# Altium footprint library BaseBoard.PcbLib: 128 footprints (part 6 of 8)
Each footprint in its own frame and in the unit in brackets; x right, y up, seen from the top. Pads: shape width x height; smd on the part's side, far side on the other; paste and mask are expansions set on the pad; w line width, h text height; cw(c..) or ccw(c..) is an arc to the next point about the centre after c.
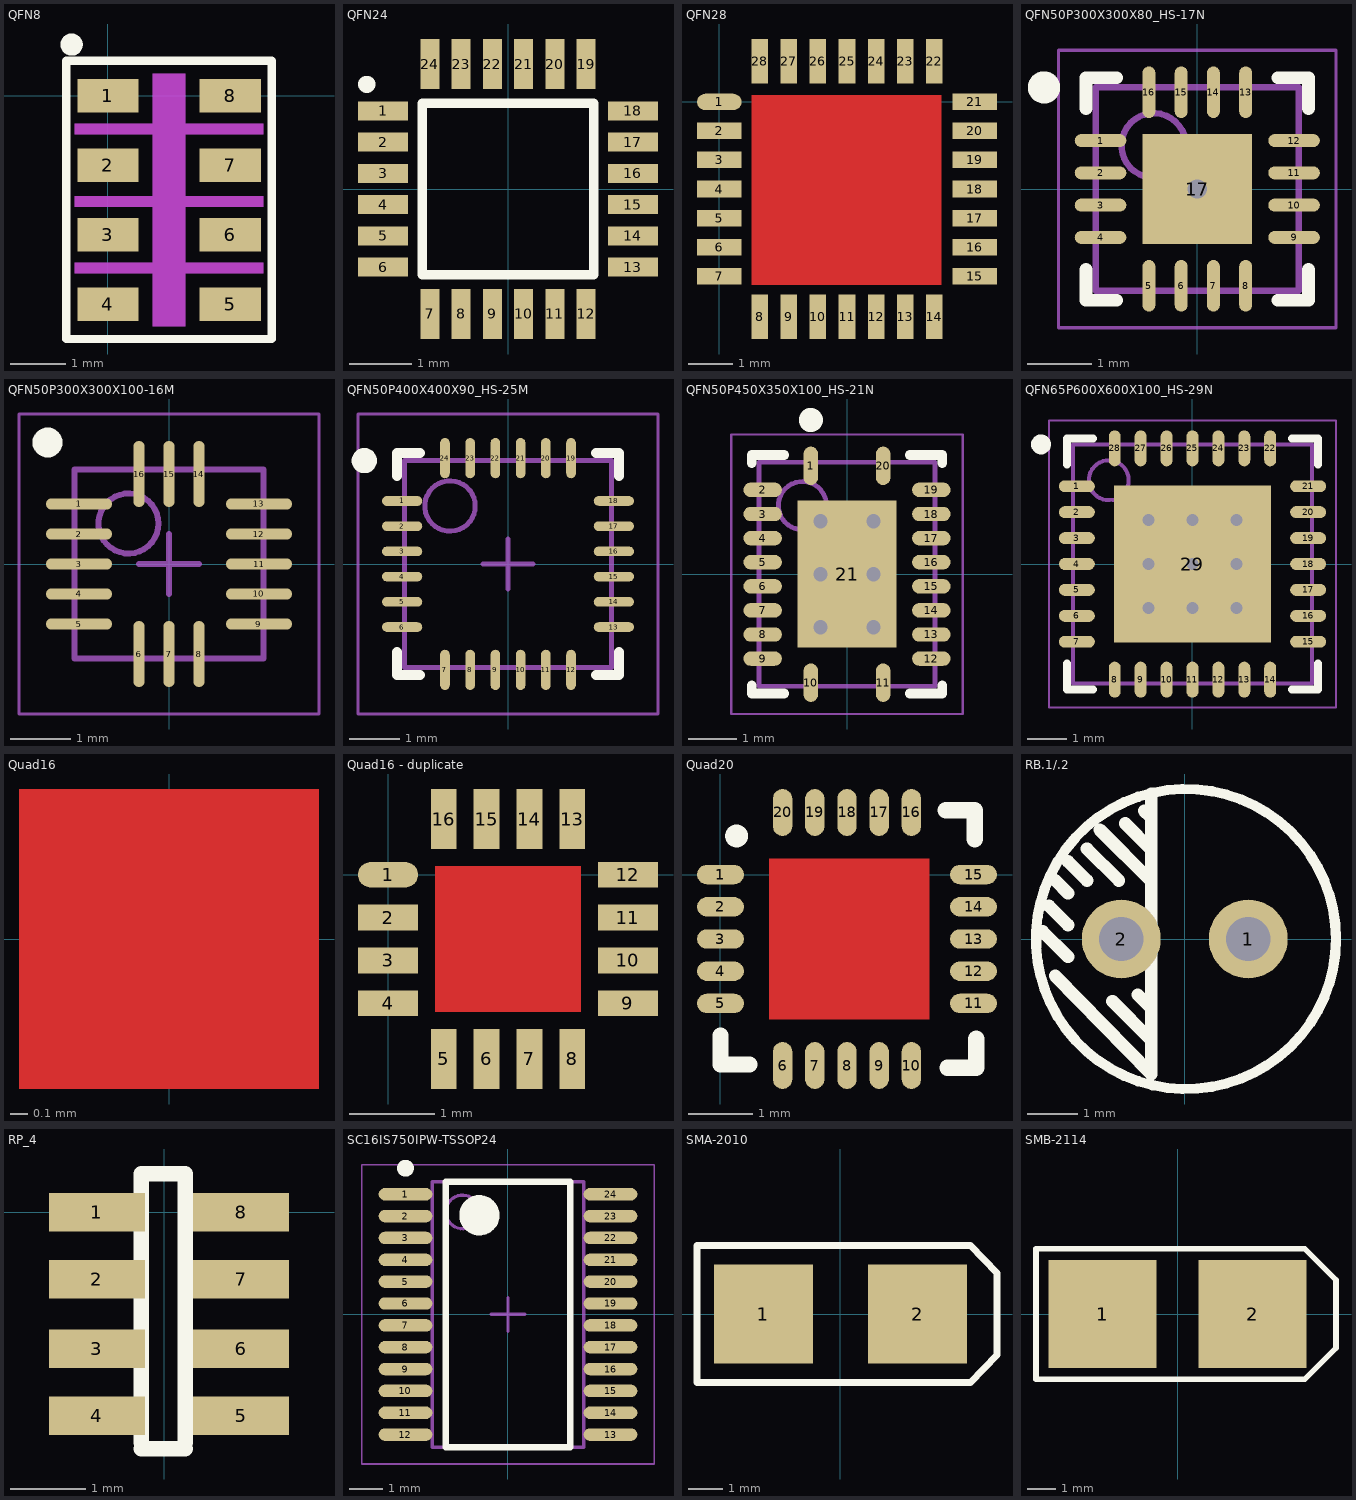
[diagram p5: the footprints below, top view; thin cyan lines are the x and y axes]

## QFN8 [mm] "5*3*1.7"
pads (8):
  rect 1.1x0.6 smd: 1(0,0) 2(0,-1.25) 3(0,-2.5) 4(0,-3.75) 5(2.2,-3.75) 6(2.2,-2.5) 7(2.2,-1.25) 8(2.2,0)
Top Overlay:
  circle w0.2: c-0.651,0.919 r0.1
  lines w0.152: -0.75,-4.375 -0.75,0.625 2.95,0.625 2.95,-4.375 -0.75,-4.375
Mechanical 1 keep-out:
  rectangle: 0.8,-4.15 1.4,0.4
  rectangle: -0.6,-0.7 2.8,-0.5
  rectangle: -0.6,-2 2.8,-1.8
  rectangle: -0.6,-3.2 2.8,-3
3D body: height 1, standoff 0, extent -0.6,-4.4 2.8,0.6

## QFN24 [mm] "4 * 4 mm"
pads (24):
  rect 0.8x0.3 smd: 1(-2,1.25) 2(-2,0.75) 3(-2,0.25) 4(-2,-0.25) 5(-2,-0.75) 6(-2,-1.25) 13(2,-1.25) 14(2,-0.75) 15(2,-0.25) 16(2,0.25) 17(2,0.75) 18(2,1.25)
  rect 0.3x0.8 smd: 7(-1.25,-2) 8(-0.75,-2) 9(-0.25,-2) 10(0.25,-2) 11(0.75,-2) 12(1.25,-2) 19(1.25,2) 20(0.75,2) 21(0.25,2) 22(-0.25,2) 23(-0.75,2) 24(-1.25,2)
Top Overlay:
  circle w0.254: c-2.26,1.675 r0.01
  lines w0.152: -1.372,-1.375 -1.372,1.375 1.375,1.375 1.375,-1.375 -1.372,-1.375

## QFN28 [mm]
pads (28):
  oval 1x0.37 smd: 1(0,0)
  rect 1x0.37 smd: 2(0,-0.65) 3(0,-1.3) 4(0,-1.95) 5(0,-2.6) 6(0,-3.25) 7(0,-3.9) 15(5.72,-3.9) 16(5.72,-3.25) 17(5.72,-2.6) 18(5.72,-1.95) 19(5.72,-1.3) 20(5.72,-0.65) 21(5.72,0)
  rect 0.37x1 smd: 8(0.91,-4.81) 9(1.56,-4.81) 10(2.21,-4.81) 11(2.86,-4.81) 12(3.51,-4.81) 13(4.16,-4.81) 14(4.81,-4.81) 22(4.81,0.91) 23(4.16,0.91) 24(3.51,0.91) 25(2.86,0.91) 26(2.21,0.91) 27(1.56,0.91) 28(0.91,0.91)
Top Layer:
  rectangle: 0.725,-4.1 4.975,0.15

## QFN50P300X300X80_HS-17N [mm] "QFN, 16-Leads, Body 3.00x3.00mm, Pitch 0.50mm, Thermal Pad 1.70x1.70mm, IPC Medium Density"
height 0.8
pads (17):
  oval 0.8x0.2 smd: 1(-1.5,0.75) 2(-1.5,0.25) 3(-1.5,-0.25) 4(-1.5,-0.75) 9(1.5,-0.75) 10(1.5,-0.25) 11(1.5,0.25) 12(1.5,0.75)
  oval 0.2x0.8 smd: 5(-0.75,-1.5) 6(-0.25,-1.5) 7(0.25,-1.5) 8(0.75,-1.5) 13(0.75,1.5) 14(0.25,1.5) 15(-0.25,1.5) 16(-0.75,1.5)
  rect 1.7x1.7 smd: 17(0,0)
via 0,0 diameter 0.6 hole 0.3
Top Overlay:
  circle w0.25: c-2.375,1.575 r0.125
  lines w0.2: -1.725,-1.25 -1.725,-1.725 -1.25,-1.725 ; -1.725,1.25 -1.725,1.725 -1.25,1.725 ; 1.25,-1.725 1.725,-1.725 1.725,-1.25 ; 1.25,1.725 1.725,1.725 1.725,1.25
Mechanical 13:
  circle w0.1: c-0.675,0.675 r0.5
  lines w0.1: -1.575,-1.575 1.575,-1.575 1.575,1.575 -1.575,1.575 -1.575,-1.575
Mechanical 15:
  lines w0.05: -2.15,-2.15 2.15,-2.15 2.15,2.15 -2.15,2.15 -2.15,-2.15
  lines w0.1: -0.5,0 0.5,0 ; 0,-0.5 0,0.5
3D body: height 0.8, standoff 0.01, extent -1.575,-1.575 1.575,1.575

## QFN50P300X300X100-16M [mm] "QFN, 16-Leads, Body 3.00x3.00mm, Pitch 0.65mm/0.50mm, IPC Low Density"
height 1
pads (16):
  oval 1.1x0.19 smd: 1(-1.5,1) 2(-1.5,0.5) 3(-1.5,0) 4(-1.5,-0.5) 5(-1.5,-1) 9(1.5,-1) 10(1.5,-0.5) 11(1.5,0) 12(1.5,0.5) 13(1.5,1)
  oval 0.19x1.1 smd: 6(-0.5,-1.5) 7(0,-1.5) 8(0.5,-1.5) 14(0.5,1.5) 15(0,1.5) 16(-0.5,1.5)
Top Overlay:
  circle w0.25: c-2.025,2.025 r0.125
Mechanical 13:
  circle w0.1: c-0.675,0.675 r0.5
  lines w0.1: -1.575,-1.575 -1.575,1.575 1.575,1.575 1.575,-1.575 -1.575,-1.575
Mechanical 15:
  lines w0.05: -2.5,-2.5 -2.5,2.5 2.5,2.5 2.5,-2.5 -2.5,-2.5
  lines w0.1: -0.5,0 0.5,0 ; 0,-0.5 0,0.5
3D body: height 1, standoff 0.2, extent -1.575,-1.575 1.575,1.575

## QFN50P400X400X90_HS-25M [mm] "QFN, 24-Leads, Body 4.00x4.00mm, Pitch 0.50mm, Thermal Pad 2.60x2.70mm, IPC Low Density"
height 0.9
pads (24):
  oval 0.8x0.2 smd: 1(-2.1,1.25)
  oval 0.8x0.19 smd: 2(-2.1,0.75) 3(-2.1,0.25) 4(-2.1,-0.25) 5(-2.1,-0.75) 6(-2.1,-1.25) 13(2.1,-1.25) 14(2.1,-0.75) 15(2.1,-0.25) 16(2.1,0.25) 17(2.1,0.75) 18(2.1,1.25)
  oval 0.19x0.8 smd: 7(-1.25,-2.1) 8(-0.75,-2.1) 9(-0.25,-2.1) 10(0.25,-2.1) 11(0.75,-2.1) 12(1.25,-2.1) 19(1.25,2.1) 20(0.75,2.1) 21(0.25,2.1) 22(-0.25,2.1) 23(-0.75,2.1) 24(-1.25,2.1)
Top Overlay:
  circle w0.25: c-2.85,2.05 r0.125
  lines w0.2: -2.2,-1.75 -2.2,-2.2 -1.75,-2.2 ; -2.2,1.75 -2.2,2.2 -1.75,2.2 ; 1.75,-2.2 2.2,-2.2 2.2,-1.75 ; 1.75,2.2 2.2,2.2 2.2,1.75
Mechanical 13:
  circle w0.1: c-1.15,1.15 r0.5
  lines w0.1: -2.05,-2.05 2.05,-2.05 2.05,2.05 -2.05,2.05 -2.05,-2.05
Mechanical 15:
  lines w0.05: -2.975,-2.975 2.975,-2.975 2.975,2.975 -2.975,2.975 -2.975,-2.975
  lines w0.1: -0.5,0 0.5,0 ; 0,-0.5 0,0.5
3D body: height 0.9, standoff 0.02, extent -2.05,-2.05 2.05,2.05

## QFN50P450X350X100_HS-21N [mm] "QFN, 20-Leads, Body 4.50x3.50mm, Pitch 0.50mm/1.50mm, Thermal Pad 3.05x2.05mm, IPC Medium Density"
height 1
pads (21):
  oval 0.3x0.8 smd: 1(-0.75,2.25) 10(-0.75,-2.25) 11(0.75,-2.25) 20(0.75,2.25)
  oval 0.8x0.3 smd: 2(-1.75,1.75) 3(-1.75,1.25) 4(-1.75,0.75) 5(-1.75,0.25) 6(-1.75,-0.25) 7(-1.75,-0.75) 8(-1.75,-1.25) 9(-1.75,-1.75) 12(1.75,-1.75) 13(1.75,-1.25) 14(1.75,-0.75) 15(1.75,-0.25) 16(1.75,0.25) 17(1.75,0.75) 18(1.75,1.25) 19(1.75,1.75)
  rect 2.05x3.05 smd: 21(0,0)
via -0.55,1.1 diameter 0.5 hole 0.3
via 0.55,1.1 diameter 0.5 hole 0.3
via -0.55,0 diameter 0.5 hole 0.3
via 0.55,0 diameter 0.5 hole 0.3
via -0.55,-1.1 diameter 0.5 hole 0.3
via 0.55,-1.1 diameter 0.5 hole 0.3
Top Overlay:
  circle w0.25: c-0.75,3.2 r0.125
  lines w0.2: -1.975,-2.3 -1.975,-2.475 -1.3,-2.475 ; -1.975,2.3 -1.975,2.475 -1.3,2.475 ; 1.3,-2.475 1.975,-2.475 1.975,-2.3 ; 1.3,2.475 1.975,2.475 1.975,2.3
Mechanical 13:
  circle w0.1: c-0.925,1.425 r0.5
  lines w0.1: -1.825,-2.325 -1.825,2.325 1.825,2.325 1.825,-2.325 -1.825,-2.325
Mechanical 15:
  lines w0.05: -2.4,-2.9 -2.4,2.9 2.4,2.9 2.4,-2.9 -2.4,-2.9
  lines w0.1: -0.5,0 0.5,0 ; 0,-0.5 0,0.5
3D body: height 1, standoff 0.01, extent -1.825,-2.325 1.825,2.325

## QFN65P600X600X100_HS-29N [mm] "QFN, 28-Leads, Body 6.00x6.00mm, Pitch 0.65mm, Thermal Pad 3.93x3.93mm, IPC Medium Density"
height 1
pads (29):
  oval 0.9x0.3 smd: 1(-2.9,1.95) 2(-2.9,1.3) 3(-2.9,0.65) 4(-2.9,0) 5(-2.9,-0.65) 6(-2.9,-1.3) 7(-2.9,-1.95) 15(2.9,-1.95) 16(2.9,-1.3) 17(2.9,-0.65) 18(2.9,0) 19(2.9,0.65) 20(2.9,1.3) 21(2.9,1.95)
  oval 0.3x0.9 smd: 8(-1.95,-2.9) 9(-1.3,-2.9) 10(-0.65,-2.9) 11(0,-2.9) 12(0.65,-2.9) 13(1.3,-2.9) 14(1.95,-2.9) 22(1.95,2.9) 23(1.3,2.9) 24(0.65,2.9) 25(0,2.9) 26(-0.65,2.9) 27(-1.3,2.9) 28(-1.95,2.9)
  rect 3.93x3.93 smd: 29(0,0)
via 1.1,-1.1 diameter 0.6 hole 0.3
via 0,-1.1 diameter 0.6 hole 0.3
via -1.1,-1.1 diameter 0.6 hole 0.3
via 1.1,0 diameter 0.6 hole 0.3
via 0,0 diameter 0.6 hole 0.3
via -1.1,0 diameter 0.6 hole 0.3
via 1.1,1.1 diameter 0.6 hole 0.3
via 0,1.1 diameter 0.6 hole 0.3
via -1.1,1.1 diameter 0.6 hole 0.3
Top Overlay:
  circle w0.25: c-3.8,3 r0.125
  lines w0.2: -3.15,-2.5 -3.15,-3.15 -2.5,-3.15 ; -3.15,2.5 -3.15,3.15 -2.5,3.15 ; 2.5,-3.15 3.15,-3.15 3.15,-2.5 ; 2.5,3.15 3.15,3.15 3.15,2.5
Mechanical 13:
  circle w0.1: c-2.1,2.1 r0.5
  lines w0.1: -3,-3 3,-3 3,3 -3,3 -3,-3
Mechanical 15:
  lines w0.05: -3.6,-3.6 3.6,-3.6 3.6,3.6 -3.6,3.6 -3.6,-3.6
  lines w0.1: -0.5,0 0.5,0 ; 0,-0.5 0,0.5
3D body: height 1, standoff 0.01, extent -3,-3 3,3

## Quad16 [mm]
Top Layer:
  rectangle: -0.85,-0.85 0.85,0.85

## Quad16 - duplicate [mm]
pads (16):
  oval 0.7x0.3 smd: 1(0,0)
  rect 0.7x0.3 smd: 2(0,-0.5) 3(0,-1) 4(0,-1.5) 9(2.8,-1.5) 10(2.8,-1) 11(2.8,-0.5) 12(2.8,0)
  rect 0.3x0.7 smd: 5(0.65,-2.15) 6(1.15,-2.15) 7(1.65,-2.15) 8(2.15,-2.15) 13(2.15,0.65) 14(1.65,0.65) 15(1.15,0.65) 16(0.65,0.65)
Top Layer:
  rectangle: 0.55,-1.6 2.25,0.1

## Quad20 [mm]
pads (20):
  oval 0.73x0.3 smd: 1(0,0) 2(0,-0.5) 3(0,-1) 4(0,-1.5) 5(0,-2) 11(3.93,-2) 12(3.93,-1.5) 13(3.93,-1) 14(3.93,-0.5) 15(3.93,0)
  oval 0.3x0.73 smd: 6(0.965,-2.965) 7(1.465,-2.965) 8(1.965,-2.965) 9(2.465,-2.965) 10(2.965,-2.965) 16(2.965,0.965) 17(2.465,0.965) 18(1.965,0.965) 19(1.465,0.965) 20(0.965,0.965)
Top Layer:
  rectangle: 0.75,-2.25 3.25,0.25
Top Overlay:
  circle w0.254: c0.25,0.6 r0.05
  lines w0.254: 0,-2.5 0,-2.95 0.45,-2.95 ; 3.5,1 3.95,1 3.95,0.55 ; 3.525,-3 3.975,-3 3.975,-2.55

## RB.1/.2 [mil]
pads (2):
  round 62 hole 35: 1(50,0) 2(-50,0)
Top Overlay:
  circle w8: c1,0 r118.11
  lines w10: -111.87,6 -91.87,-14 ; -106.87,26 -91.87,11 ; -101.87,-29 -26.38,-106.3 -26.38,114.17 ; -101.87,46 -91.87,36 ; -91.87,61 -76.87,46 ; -76.87,71 -51.87,46 ; -66.87,86 -26.87,46 ; -56.87,-49 -26.87,-79 ; -46.87,91 -26.87,71 ; -36.87,-44 -26.87,-54 ; -31.87,101 -26.87,96

## RP_4 [mil]
pads (8):
  rect 50x20 smd: 1(-35,0) 2(-35,-35) 3(-35,-71) 4(-35,-106) 5(40,-106) 6(40,-71) 7(40,-35) 8(40,0)
Top Overlay:
  lines w8: -12,-123 11,-123 ; -12,-120 -12,20 ; -11,20 9,20 ; 11,-120 11,20

## SC16IS750IPW-TSSOP24 [mm] "TSOP, 24-Leads, Body 7.80x4.40mm, Pitch 0.65mm, IPC Low Density"
height 1.1
pads (24):
  oval 1.6x0.37 smd: 1(-3.05,3.575) 2(-3.05,2.925) 3(-3.05,2.275) 4(-3.05,1.625) 5(-3.05,0.975) 6(-3.05,0.325) 7(-3.05,-0.325) 8(-3.05,-0.975) 9(-3.05,-1.625) 10(-3.05,-2.275) 11(-3.05,-2.925) 12(-3.05,-3.575) 13(3.05,-3.575) 14(3.05,-2.925) 15(3.05,-2.275) 16(3.05,-1.625) 17(3.05,-0.975) 18(3.05,-0.325) 19(3.05,0.325) 20(3.05,0.975) 21(3.05,1.625) 22(3.05,2.275) 23(3.05,2.925) 24(3.05,3.575)
Top Overlay:
  circle w0.25: c-3.05,4.35 r0.125
  circle w0.6: c-0.85,2.95 r0.3
  lines w0.2: -1.85,-3.95 -1.85,3.95 1.85,3.95 1.85,-3.95 -1.85,-3.95
Mechanical 13:
  circle w0.1: c-1.35,3.05 r0.5
  lines w0.1: -2.25,-3.95 -2.25,3.95 2.25,3.95 2.25,-3.95 -2.25,-3.95
Mechanical 15:
  lines w0.05: -4.35,-4.45 -4.35,4.45 4.35,4.45 4.35,-4.45 -4.35,-4.45
  lines w0.1: -0.5,0 0.5,0 ; 0,-0.5 0,0.5
3D body "TSOP65P640X110-24M.step": height 1.1, standoff 0, extent -3.2,-3.95 3.2,3.95

## SMA-2010 [mm]
height 0.55
pads (2):
  rect 2.9x2.9 smd: 1(-2.25,0) 2(2.25,0)
Top Overlay:
  lines w0.2: -4.191,-2 3.8,-2 4.572,-1.197 4.572,1.197 3.8,2 -4.191,2 -4.191,-2

## SMB-2114 [mm]
height 0.55
pads (2):
  rect 3.8x3.8 smd: 1(-2.65,0) 2(2.65,0)
Top Overlay:
  lines w0.2: -5,-2.3 -5,2.3 4.5,2.3 5.6,1.2 5.6,-1.2 4.5,-2.3 -5,-2.3